# Altium footprint library Components.PcbLib: 260 footprints (part 10 of 17)
Each footprint in its own frame and in the unit in brackets; x right, y up, seen from the top. Pads: shape width x height; smd on the part's side, far side on the other; paste and mask are expansions set on the pad; w line width, h text height; cw(c..) or ccw(c..) is an arc to the next point about the centre after c.
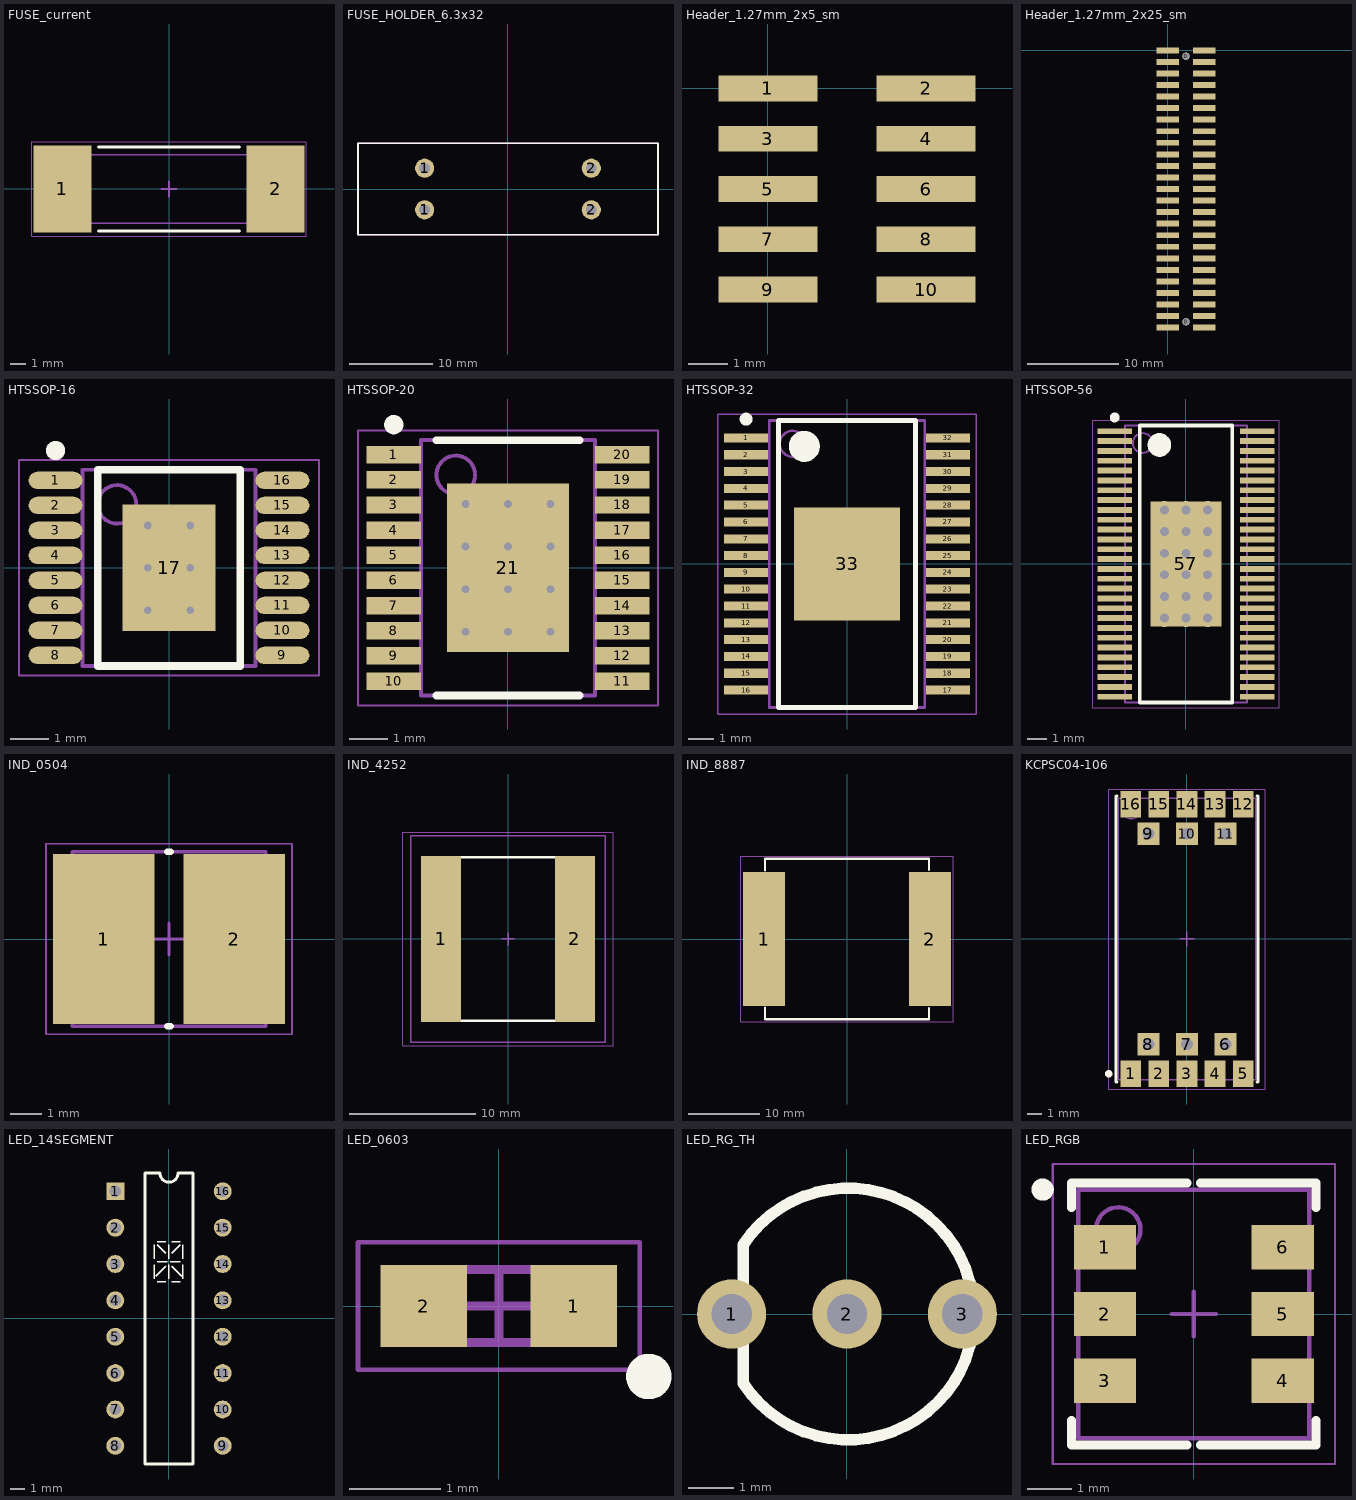
[diagram p9: the footprints below, top view; thin cyan lines are the x and y axes]

## FUSE_current [mm] "FUSE, 2-Leads, Body 16,13x4,40mm, IPC Medium Density"
height 4.4
pads (2):
  rect 3.75x5.6 smd: 1(-6.875,0) 2(6.875,0)
Top Overlay:
  lines w0.2: -4.55,-2.7 4.55,-2.7 ; -4.55,2.7 4.55,2.7
Mechanical 13:
  lines w0.1: -8.25,-2.2 -8.25,2.2 8.25,2.2 8.25,-2.2 -8.25,-2.2
Mechanical 15:
  lines w0.05: -8.85,-3.05 -8.85,3.05 8.85,3.05 8.85,-3.05 -8.85,-3.05
  lines w0.1: -0.5,0 0.5,0 ; 0,-0.5 0,0.5
3D body: height 4.4, standoff 0, extent -5.26,-2.2 5.26,2.2
3D body: height 4.4, standoff 0, extent -8.25,-2.2 -5.26,2.2
3D body: height 4.4, standoff 0, extent 5.26,-2.2 8.25,2.2

## FUSE_HOLDER_6.3x32 [mm] "6.3x32 mm fuse holder (600V), SCHURTER  0031.8231"
height 12.7
pads (4):
  round 2.3 hole 1.3: 1(-10,-2.5) 1(-10,2.5) 2(10,-2.5) 2(10,2.5)
Top Overlay:
  lines w0.2: -18,-5.5 18,-5.5 18,5.5 -18,5.5 -18,-5.5
Mechanical 13:
  lines w0.2: -18,-5.5 -18,5.5 18,5.5 18,-5.5 -18,-5.5
3D body "SCHURTER  0031.8231 fuse holder.stp": height 12.7, standoff -3.13, extent -17.7,-5.45 17.7,5.45

## Header_1.27mm_2x5_sm [mm]
pads (10):
  rect 2.5x0.65 smd: 1(0,0) 2(4,0) 3(0,-1.27) 4(4,-1.27) 5(0,-2.54) 6(4,-2.54) 7(0,-3.81) 8(4,-3.81) 9(0,-5.08) 10(4,-5.08)

## Header_1.27mm_2x25_sm [mm]
pads (52):
  round 0.8 hole 0.8 unplated: 0(2,-29.845) 0(2,-0.635)
  rect 2.5x0.65 smd: 1(0,0) 2(4,0) 3(0,-1.27) 4(4,-1.27) 5(0,-2.54) 6(4,-2.54) 7(0,-3.81) 8(4,-3.81) 9(0,-5.08) 10(4,-5.08) 11(0,-6.35) 12(4,-6.35) 13(0,-7.62) 14(4,-7.62) 15(0,-8.89) 16(4,-8.89) 17(0,-10.16) 18(4,-10.16) 19(0,-11.43) 20(4,-11.43) 21(0,-12.7) 22(4,-12.7) 23(0,-13.97) 24(4,-13.97) 25(0,-15.24) 26(4,-15.24) 27(0,-16.51) 28(4,-16.51) 29(0,-17.78) 30(4,-17.78) 31(0,-19.05) 32(4,-19.05) 33(0,-20.32) 34(4,-20.32) 35(0,-21.59) 36(4,-21.59) 37(0,-22.86) 38(4,-22.86) 39(0,-24.13) 40(4,-24.13) 41(0,-25.4) 42(4,-25.4) 43(0,-26.67) 44(4,-26.67) 45(0,-27.94) 46(4,-27.94) 47(0,-29.21) 48(4,-29.21) 49(0,-30.48) 50(4,-30.48)

## HTSSOP-16 [mm]
height 1.2
pads (17):
  oval 1.4x0.45 smd: 1(-2.95,2.275) 2(-2.95,1.625) 3(-2.95,0.975) 4(-2.95,0.325) 5(-2.95,-0.325) 6(-2.95,-0.975) 7(-2.95,-1.625) 8(-2.95,-2.275) 9(2.95,-2.275) 10(2.95,-1.625) 11(2.95,-0.975) 12(2.95,-0.325) 13(2.95,0.325) 14(2.95,0.975) 15(2.95,1.625) 16(2.95,2.275)
  rect 2.41x3.29 smd: 17(0,0)
via 0.55,-1.1 diameter 0.5 hole 0.2
via -0.55,-1.1 diameter 0.5 hole 0.2
via 0.55,0 diameter 0.5 hole 0.2
via -0.55,0 diameter 0.5 hole 0.2
via 0.55,1.1 diameter 0.5 hole 0.2
via -0.55,1.1 diameter 0.5 hole 0.2
Top Overlay:
  circle w0.25: c-2.95,3.05 r0.125
  lines w0.2: -1.85,-2.55 1.85,-2.55 1.85,2.55 -1.85,2.55 -1.85,-2.55
Mechanical 13:
  circle w0.1: c-1.35,1.65 r0.5
  lines w0.1: -2.25,-2.55 2.25,-2.55 2.25,2.55 -2.25,2.55 -2.25,-2.55
Mechanical 15:
  lines w0.05: -3.9,-2.8 3.9,-2.8 3.9,2.8 -3.9,2.8 -3.9,-2.8
  lines w0.1: -0.5,0 0.5,0 ; 0,-0.5 0,0.5
3D body "TSSOP-16.step": height 1, standoff 0, extent -3.2,-2.5 3.2,2.5

## HTSSOP-20 [mm]
height 1.1
pads (21):
  rect 1.4x0.45 smd: 1(-2.95,2.925) 2(-2.95,2.275) 3(-2.95,1.625) 4(-2.95,0.975) 5(-2.95,0.325) 6(-2.95,-0.325) 7(-2.95,-0.975) 8(-2.95,-1.625) 9(-2.95,-2.275) 10(-2.95,-2.925) 11(2.95,-2.925) 12(2.95,-2.275) 13(2.95,-1.625) 14(2.95,-0.975) 15(2.95,-0.325) 16(2.95,0.325) 17(2.95,0.975) 18(2.95,1.625) 19(2.95,2.275) 20(2.95,2.925)
  rect 3.15x4.35 smd: 21(0,0)
via 1.1,-1.65 diameter 0.5 hole 0.2
via 0,-1.65 diameter 0.5 hole 0.2
via -1.1,-1.65 diameter 0.5 hole 0.2
via 1.1,-0.55 diameter 0.5 hole 0.2
via 0,-0.55 diameter 0.5 hole 0.2
via -1.1,-0.55 diameter 0.5 hole 0.2
via 1.1,0.55 diameter 0.5 hole 0.2
via 0,0.55 diameter 0.5 hole 0.2
via -1.1,0.55 diameter 0.5 hole 0.2
via 1.1,1.65 diameter 0.5 hole 0.2
via 0,1.65 diameter 0.5 hole 0.2
via -1.1,1.65 diameter 0.5 hole 0.2
Top Overlay:
  circle w0.25: c-2.95,3.7 r0.125
  lines w0.2: -1.85,-3.3 1.85,-3.3 ; -1.85,3.3 1.85,3.3
Mechanical 13:
  circle w0.1: c-1.35,2.4 r0.5
  lines w0.1: -2.25,-3.3 2.25,-3.3 2.25,3.3 -2.25,3.3 -2.25,-3.3
Mechanical 15:
  lines w0.05: -3.875,-3.55 3.875,-3.55 3.875,3.55 -3.875,3.55 -3.875,-3.55
  lines w0.1: -0.5,0 0.5,0 ; 0,-0.5 0,0.5
3D body "TSSOP-20.step": height 1.2, standoff 0, extent -3.275,-3.3 3.275,3.3

## HTSSOP-32 [mm] "TSSOP, 32-Leads, Body 11.10x6.10mm, Pitch 0.65mm, Thermal Pad 3.91x3.61mm, IPC Medium Density"
height 1.2
pads (33):
  rect 1.7x0.35 smd: 1(-3.9,4.875) 2(-3.9,4.225) 3(-3.9,3.575) 4(-3.9,2.925) 5(-3.9,2.275) 6(-3.9,1.625) 7(-3.9,0.975) 8(-3.9,0.325) 9(-3.9,-0.325) 10(-3.9,-0.975) 11(-3.9,-1.625) 12(-3.9,-2.275) 13(-3.9,-2.925) 14(-3.9,-3.575) 15(-3.9,-4.225) 16(-3.9,-4.875) 17(3.9,-4.875) 18(3.9,-4.225) 19(3.9,-3.575) 20(3.9,-2.925) 21(3.9,-2.275) 22(3.9,-1.625) 23(3.9,-0.975) 24(3.9,-0.325) 25(3.9,0.325) 26(3.9,0.975) 27(3.9,1.625) 28(3.9,2.275) 29(3.9,2.925) 30(3.9,3.575) 31(3.9,4.225) 32(3.9,4.875)
  rect 4.11x4.36 smd: 33(0,0)
Top Overlay:
  circle w0.25: c-3.9,5.6 r0.125
  circle w0.6: c-1.65,4.55 r0.3
  lines w0.2: -2.65,-5.55 -2.65,5.55 2.65,5.55 2.65,-5.55 -2.65,-5.55
Mechanical 13:
  circle w0.1: c-2.1,4.65 r0.5
  lines w0.1: -3,-5.55 -3,5.55 3,5.55 3,-5.55 -3,-5.55
Mechanical 15:
  lines w0.05: -5,-5.8 -5,5.8 5,5.8 5,-5.8 -5,-5.8
  lines w0.1: -0.5,0 0.5,0 ; 0,-0.5 0,0.5
3D body: height 1.2, standoff 0.25, extent -3,-5.55 3,5.55

## HTSSOP-56 [mm] "TSSOP, 56-Leads, Body 14,00x6,10mm, Pitch 0,50mm, Thermal Pad 6,35.2x3,61.2mm, IPC Medium Density"
height 1.2
pads (57):
  rect 1.75x0.3 smd: 1(-3.625,6.75) 2(-3.625,6.25) 3(-3.625,5.75) 4(-3.625,5.25) 5(-3.625,4.75) 6(-3.625,4.25) 7(-3.625,3.75) 8(-3.625,3.25) 9(-3.625,2.75) 10(-3.625,2.25) 11(-3.625,1.75) 12(-3.625,1.25) 13(-3.625,0.75) 14(-3.625,0.25) 15(-3.625,-0.25) 16(-3.625,-0.75) 17(-3.625,-1.25) 18(-3.625,-1.75) 19(-3.625,-2.25) 20(-3.625,-2.75) 21(-3.625,-3.25) 22(-3.625,-3.75) 23(-3.625,-4.25) 24(-3.625,-4.75) 25(-3.625,-5.25) 26(-3.625,-5.75) 27(-3.625,-6.25) 28(-3.625,-6.75) 29(3.625,-6.75) 30(3.625,-6.25) 31(3.625,-5.75) 32(3.625,-5.25) 33(3.625,-4.75) 34(3.625,-4.25) 35(3.625,-3.75) 36(3.625,-3.25) 37(3.625,-2.75) 38(3.625,-2.25) 39(3.625,-1.75) 40(3.625,-1.25) 41(3.625,-0.75) 42(3.625,-0.25) 43(3.625,0.25) 44(3.625,0.75) 45(3.625,1.25) 46(3.625,1.75) 47(3.625,2.25) 48(3.625,2.75) 49(3.625,3.25) 50(3.625,3.75) 51(3.625,4.25) 52(3.625,4.75) 53(3.625,5.25) 54(3.625,5.75) 55(3.625,6.25) 56(3.625,6.75)
  rect 3.61x6.35 smd: 57(0,0)
via 1.1,-2.75 diameter 0.9 hole 0.45
via 0,-2.75 diameter 0.9 hole 0.45
via -1.1,-2.75 diameter 0.9 hole 0.45
via 1.1,-1.65 diameter 0.9 hole 0.45
via 0,-1.65 diameter 0.9 hole 0.45
via -1.1,-1.65 diameter 0.9 hole 0.45
via 1.1,-0.55 diameter 0.9 hole 0.45
via 0,-0.55 diameter 0.9 hole 0.45
via -1.1,-0.55 diameter 0.9 hole 0.45
via 1.1,0.55 diameter 0.9 hole 0.45
via 0,0.55 diameter 0.9 hole 0.45
via -1.1,0.55 diameter 0.9 hole 0.45
via 1.1,1.65 diameter 0.9 hole 0.45
via 0,1.65 diameter 0.9 hole 0.45
via -1.1,1.65 diameter 0.9 hole 0.45
via 1.1,2.75 diameter 0.9 hole 0.45
via 0,2.75 diameter 0.9 hole 0.45
via -1.1,2.75 diameter 0.9 hole 0.45
Top Overlay:
  circle w0.6: c-1.35,6.05 r0.3
  circle w0.25: c-3.625,7.45 r0.125
  lines w0.2: -2.35,-7.05 2.35,-7.05 2.35,7.05 -2.35,7.05 -2.35,-7.05
Mechanical 13:
  circle w0.1: c-2.2,6.15 r0.5
  lines w0.1: -3.1,-7.05 3.1,-7.05 3.1,7.05 -3.1,7.05 -3.1,-7.05
Mechanical 15:
  lines w0.05: -4.75,-7.3 4.75,-7.3 4.75,7.3 -4.75,7.3 -4.75,-7.3
  lines w0.1: -0.5,0 0.5,0 ; 0,-0.5 0,0.5
3D body "HTSSOP-56.STEP": height 1.14, standoff -0.4, extent -4.072,-7.031 4.072,7.05

## IND_0504 [mm] "Precision Wire Wound Inductor, 2-Leads, Body 5,80x5,20mm, IPC Medium Density"
height 4.85
pads (2):
  rect 3.2x5.35 smd: 1(-2.05,0) 2(2.05,0)
Top Overlay:
  lines w0.2: -0.05,-2.75 0.05,-2.75 ; -0.05,2.75 0.05,2.75
Mechanical 13:
  lines w0.1: -3.05,-2.75 3.05,-2.75 3.05,2.75 -3.05,2.75 -3.05,-2.75
Mechanical 15:
  lines w0.05: -3.875,-3 3.875,-3 3.875,3 -3.875,3 -3.875,-3
  lines w0.1: -0.5,0 0.5,0 ; 0,-0.5 0,0.5
3D body "User Library-4532-1.STEP": height 3.23, standoff -0.02, extent -2.244,-2.057 2.245,1.943

## IND_4252 [mm] "Power Inductor, 2-Leads, Body 15,20x16,20mm, IPC Medium Density"
height 13
pads (2):
  rect 3.18x13.2 smd: 1(-5.3,0) 2(5.3,0)
Top Overlay:
  lines w0.2: -4.2,-6.5 4.2,-6.5 ; -4.2,6.5 4.2,6.5
Mechanical 13:
  lines w0.1: -7.7,-8.2 7.7,-8.2 7.7,8.2 -7.7,8.2 -7.7,-8.2
Mechanical 15:
  lines w0.05: -8.35,-8.45 8.35,-8.45 8.35,8.45 -8.35,8.45 -8.35,-8.45
  lines w0.1: -0.5,0 0.5,0 ; 0,-0.5 0,0.5
3D body: height 13, standoff 0, extent -7.7,-8.2 7.7,8.2

## IND_8887 [mm] "Precision Wire Wound Inductor, 2-Leads, Body 22,5x22,0mm, IPC Medium Density"
height 13
pads (2):
  rect 5.84x18.8 smd: 1(-11.62,0) 2(11.62,0)
Top Overlay:
  lines w0.3: -11.5,-9.625 -11.5,-11.25 11.5,-11.25 11.5,-9.65 ; -11.5,9.625 -11.5,11.25 11.5,11.25 11.5,9.65
Mechanical 15:
  lines w0.05: -14.875,-11.625 -14.875,1.05 -14.875,11.625 14.875,11.625 14.875,-11.625 -14.875,-11.625
3D body: height 13, standoff 0, extent -11.25,-11 11.25,11

## KCPSC04-106 [mm]
height 3.75
pads (16):
  rect 1.4x1.8 smd: 1(-3.8,-9.1) 2(-1.9,-9.1) 3(0,-9.1) 4(1.9,-9.1) 5(3.8,-9.1) 12(3.8,9.1) 13(1.9,9.1) 14(0,9.1) 15(-1.9,9.1) 16(-3.8,9.1)
  rect 1.5x1.5 hole 0.8: 6(2.6,-7.1) 7(0,-7.1) 8(-2.6,-7.1) 9(-2.6,7.1) 10(0,7.1) 11(2.6,7.1)
Top Overlay:
  circle w0.25: c-5.275,-9.1 r0.125
  lines w0.2: -4.8,-0.025 -4.8,9.613 -4.763,9.65 -4.725,9.65 ; -4.8,0.025 -4.8,-9.65 -4.725,-9.65 ; 4.725,-9.65 4.8,-9.65 4.8,0.025 ; 4.725,9.65 4.8,9.65 4.8,-0.025
Mechanical 13:
  circle w0.1: c-3.75,8.6 r0.5
  lines w0.1: -4.65,-9.5 4.65,-9.5 4.65,9.5 -4.613,9.5 -4.65,9.463 -4.65,-9.5
Mechanical 15:
  lines w0.05: -5.275,-10.125 5.275,-10.125 5.275,10.125 -5.275,10.125 -5.275,-10.125
  lines w0.1: -0.5,0 0.5,0 ; 0,-0.5 0,0.5
3D body "KCPSC04.stp": height 3.76, standoff 0, extent -4.648,-9.499 4.648,9.5

## LED_14SEGMENT [mm]
pads (16):
  rect 1.25x1.25 hole 0.8: 1(-3.716,8.883)
  round 1.25 hole 0.8: 2(-3.716,6.343) 3(-3.716,3.803) 4(-3.716,1.263) 5(-3.716,-1.277) 6(-3.716,-3.817) 7(-3.716,-6.357) 8(-3.716,-8.897) 9(3.784,-8.897) 10(3.784,-6.357) 11(3.784,-3.817) 12(3.784,-1.277) 13(3.784,1.263) 14(3.784,3.803) 15(3.784,6.343) 16(3.784,8.883)
Top Overlay:
  lines w0.1: -0.991,2.758 -0.991,3.758 ; -0.991,4.158 -0.991,5.158 ; -0.891,2.958 -0.191,3.658 ; -0.791,2.558 -0.191,2.558 ; -0.791,3.958 -0.091,3.958 ; -0.791,5.158 -0.191,4.558 ; -0.791,5.358 -0.191,5.358 ; 0.009,2.758 0.009,3.758 ; 0.009,4.158 0.009,5.158 ; 0.109,3.958 0.809,3.958 ; 0.209,2.558 0.809,2.558 ; 0.209,4.558 0.809,5.158 ; 0.209,5.358 0.809,5.358 ; 0.909,2.958 0.209,3.658 ; 1.009,2.758 1.009,3.758 ; 1.009,4.158 1.009,5.158 ; 0.209,3.658 0.209,3.658 ; 0.809,3.958 0.809,3.958
  lines w0.2: -1.631,-10.167 1.699,-10.167 1.699,10.153 0.669,10.153 cw(c0.034,10.153) -0.601,10.153 -1.631,10.153 -1.631,-10.167
3D body "14_segment_display.stp": height 9.65, standoff -4, extent -4.941,-10.422 4.965,10.408

## LED_0603 [mm]
height 0.3
pads (2):
  rect 0.95x0.9 smd: 1(0.825,0) 2(-0.825,0)
Top Overlay:
  circle w0.3: c1.65,-0.775 r0.1
Mechanical 13:
  lines w0.1: -0.8,-0.4 -0.8,0.4 0.8,0.4 0.8,-0.4 -0.8,-0.4
Mechanical 15:
  lines w0.05: -1.55,-0.7 -1.55,0.7 1.55,0.7 1.55,-0.7 -1.55,-0.7
  lines w0.1: -0.4,0 0.4,0 ; 0,-0.4 0,0.4
3D body "LED0603.step": height 0.38, standoff -0.01, extent -0.8,-0.4 0.8,0.4

## LED_RG_TH [mil]
pads (3):
  round 60 hole 35: 1(-100,0) 2(0,0) 3(100,0)
Top Overlay:
  lines w10: -90,-60 ccw(c1,0) -90,60 -90,-60
3D body "RG_LED.STEP": height 407.48, standoff -88.58, extent -109.84,-116.13 116.15,116.15

## LED_RGB [mm] "FYLS-5050"
height 1.5
pads (6):
  rect 1.4x1 smd: 1(-2,1.5) 2(-2,0) 3(-2,-1.5) 4(2,-1.5) 5(2,0) 6(2,1.5)
Top Overlay:
  circle w0.25: c-3.4,2.8 r0.125
  lines w0.2: -2.75,-2.4 -2.75,-2.95 -0.15,-2.95 ; -2.75,2.4 -2.75,2.95 -0.15,2.95 ; 0.15,-2.95 2.75,-2.95 2.75,-2.4 ; 0.15,2.95 2.75,2.95 2.75,2.4
Mechanical 13:
  circle w0.1: c-1.7,1.9 r0.5
  lines w0.1: -2.6,-2.8 2.6,-2.8 2.6,2.8 -2.6,2.8 -2.6,-2.8
Mechanical 15:
  lines w0.05: -3.175,-3.375 3.175,-3.375 3.175,3.375 -3.175,3.375 -3.175,-3.375
  lines w0.1: -0.5,0 0.5,0 ; 0,-0.5 0,0.5
3D body "rgb3d.step": height 1.5, standoff 0, extent -2.7,-2.5 2.7,2.5